# Altium footprint library lib_datalogger.PcbLib: 866 footprints (part 53 of 55)
Each footprint in its own frame and in the unit in brackets; x right, y up, seen from the top. Pads: shape width x height; smd on the part's side, far side on the other; paste and mask are expansions set on the pad; w line width, h text height; cw(c..) or ccw(c..) is an arc to the next point about the centre after c.
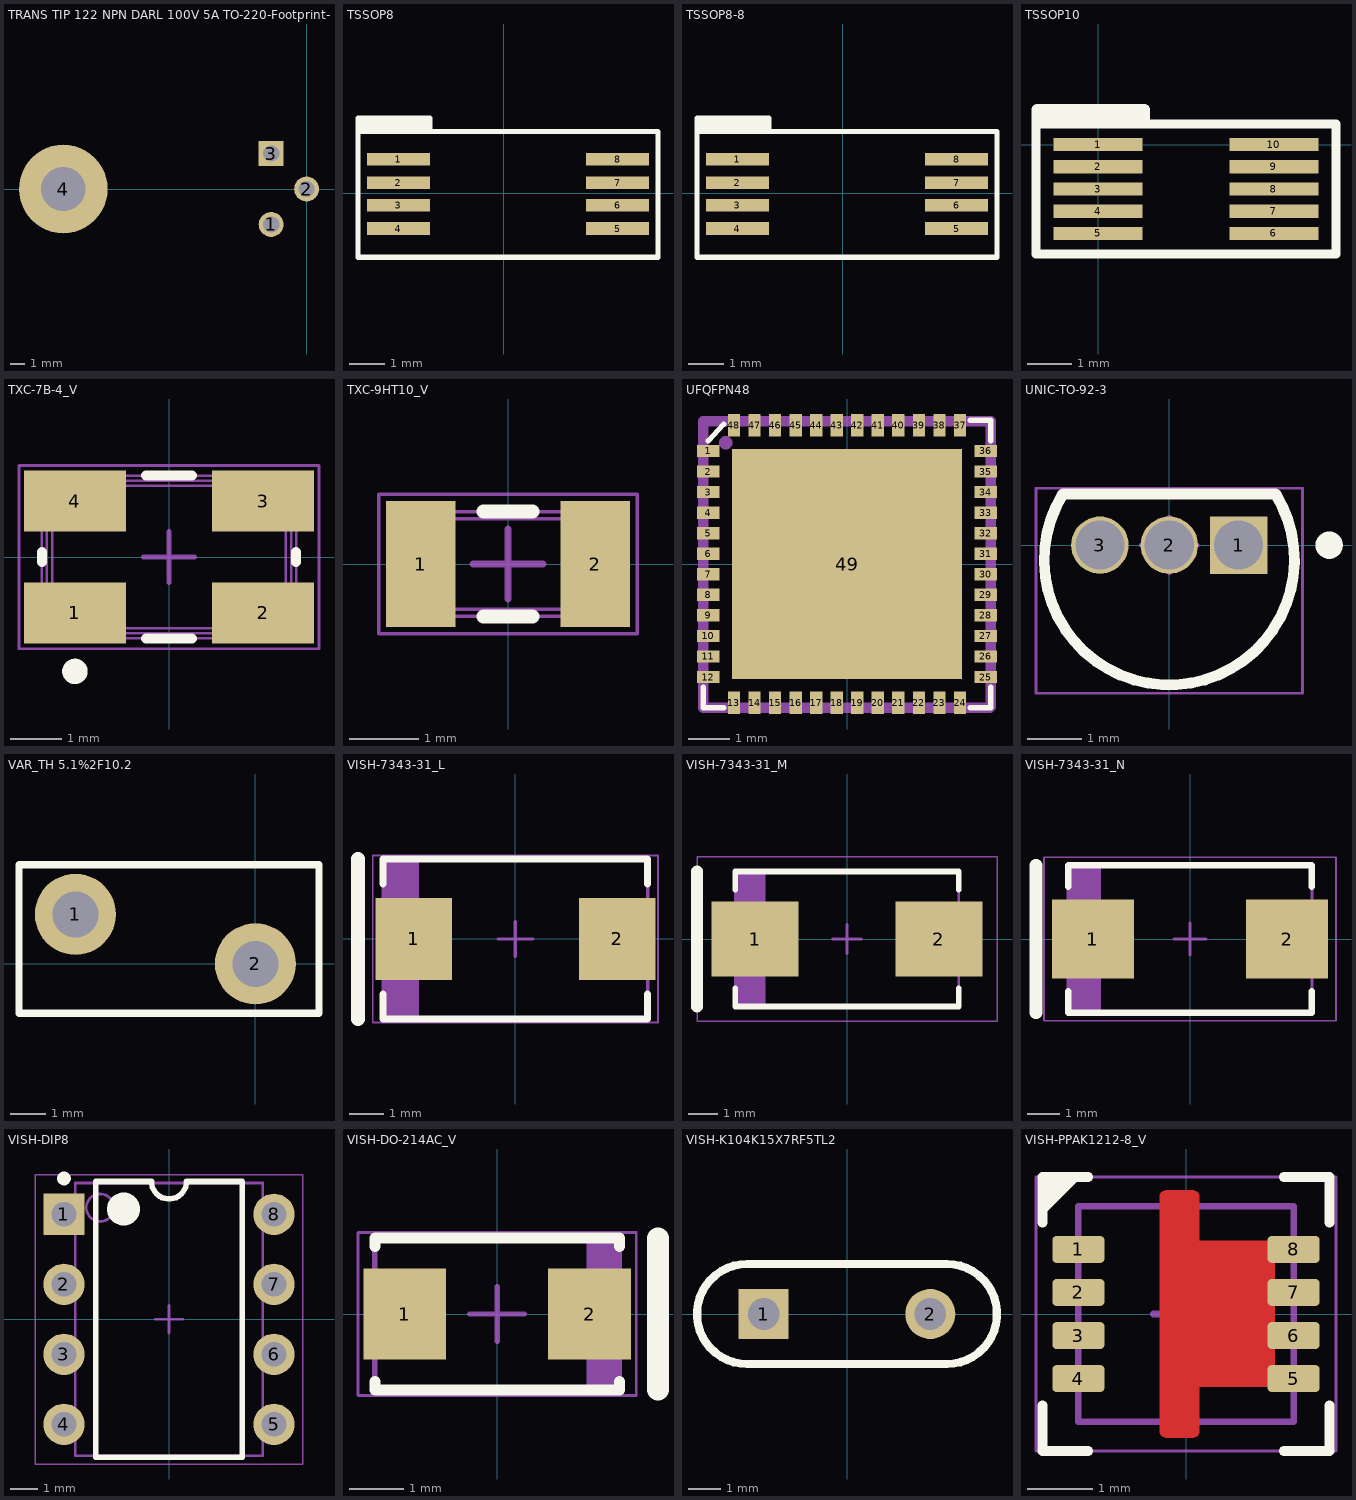
[diagram p52: the footprints below, top view; thin cyan lines are the x and y axes]

## TRANS TIP 122 NPN DARL 100V 5A TO-220-Footprint-1 [mil]
pads (4):
  round 70 hole 46: 1(-100,-100) 2(0,0)
  rect 70x70 hole 46: 3(-100,100)
  round 250 hole 125: 4(-686,0)
Bottom Overlay:
  lines w10: -441,-202 -441,202 ; -391,-202 -391,202 ; -806,-202 -806,202 -186,202 -186,-202 -806,-202
3D body: height 100, standoff -50, extent -120,80 -80,120
3D body: height 100, standoff -50, extent -20,-20 20,20
3D body: height 100, standoff -50, extent -120,-120 -80,-80
3D body: height 120, standoff 80, extent -120,-120 -80,-80
3D body: height 120, standoff 80, extent -250,-120 -100,-80
3D body: height 120, standoff 80, extent -250,80 -100,120
3D body: height 120, standoff 80, extent -250,-20 0,20
3D body: height 120, standoff 80, extent -20,-20 20,20
3D body: height 120, standoff 80, extent -120,80 -80,120
3D body: height 150, standoff 5, extent -445,-200 -190,195
3D body: height 20, standoff 5, extent -810,-200 -440,200

## TSSOP8 [mil]
pads (8):
  rect 70x14 smd: 1(-117,38) 2(-117,12) 3(-117,-13) 4(-117,-39) 5(127,-39) 6(127,-13) 7(127,12) 8(127,38)
Top Overlay:
  region: -82,69 -82,84 -162,84 -162,69
  lines w6: -82,69 -82,84 -162,84 -162,69 ; -162,69 -162,-1 -162,-71 172,-71 172,69 -162,69
3D body "TSS0P8.step": height 43, standoff 0, extent -118.62,-62.11 128.62,56

## TSSOP8-8 [mil]
pads (8):
  rect 70x14 smd: 1(-117,38) 2(-117,12) 3(-117,-13) 4(-117,-39) 5(127,-39) 6(127,-13) 7(127,12) 8(127,38)
Top Overlay:
  region: -82,69 -82,84 -162,84 -162,69
  lines w6: -82,69 -82,84 -162,84 -162,69 ; -162,69 -162,-1 -162,-71 172,-71 172,69 -162,69
3D body "TSS0P8.step": height 43, standoff 0, extent -118.62,-62.11 128.62,56

## TSSOP10 [mm]
height 2
pads (10):
  rect 2x0.3 smd: 1(0,0) 2(0,-0.5) 3(0,-1) 4(0,-1.5) 5(0,-2) 6(3.95,-2) 7(3.95,-1.5) 8(3.95,-1) 9(3.95,-0.5) 10(3.95,0)
Top Overlay:
  lines w0.2: -1.399,0.615 -1.399,-2.464 5.347,-2.464 5.347,0.457 -1.088,0.457 ; -1.348,0.463 -1.064,0.463
  lines w0.254: -1.372,0.693 -1.372,0.787 1.041,0.787 1.041,0.483 ; -1.297,0.641 1.04,0.641
3D body "MSOP-10-1.step": height 1.05, standoff 0, extent -0.539,-2.5 4.488,0.5

## TXC-7B-4_V [mm] "SMD, 4-Leads, Body 5x3.2mm, Pitch 3.7mm"
height 1.05
pads (4):
  rect 2x1.2 smd: 1(-1.85,-1.1) 2(1.85,-1.1) 3(1.85,1.1) 4(-1.85,1.1)
Top Overlay:
  circle w0.25: c-1.85,-2.25 r0.125
  lines w0.2: -2.5,-0.1 -2.5,0.1 ; -0.45,-1.6 0.45,-1.6 ; -0.45,1.6 0.45,1.6 ; 2.5,-0.1 2.5,0.1
Mechanical 13:
  lines w0.05: -2.5,-1.5 cw(c-2.5,-1.6) -2.4,-1.6 2.4,-1.6 cw(c2.5,-1.6) 2.5,-1.5 2.5,1.5 cw(c2.5,1.6) 2.4,1.6 -2.4,1.6 cw(c-2.5,1.6) -2.5,1.5 -2.5,-1.5 ; -2.4,-1.4 ccw(c-2.3,-1.4) -2.3,-1.5 2.3,-1.5 ccw(c2.3,-1.4) 2.4,-1.4 2.4,1.4 ccw(c2.3,1.4) 2.3,1.5 -2.3,1.5 ccw(c-2.3,1.4) -2.4,1.4 -2.4,-1.4 ; -2.3,-1.3 ccw(c-2.2,-1.3) -2.2,-1.4 2.2,-1.4 ccw(c2.2,-1.3) 2.3,-1.3 2.3,1.3 ccw(c2.2,1.3) 2.2,1.4 -2.2,1.4 ccw(c-2.2,1.3) -2.3,1.3 -2.3,-1.3
Mechanical 15:
  lines w0.05: -2.95,-1.8 2.95,-1.8 2.95,1.8 -2.95,1.8 -2.95,-1.8
  lines w0.1: -0.5,0 0.5,0 ; 0,-0.5 0,0.5
3D body: height 1.05, standoff 1, extent -2.299,-1.399 2.299,1.399
3D body: height 1, standoff 0.8, extent -2.399,-1.499 2.399,1.499
3D body: height 0.6, standoff 0, extent -2.501,-1.601 2.501,1.601
3D body: height 0.8, standoff 0.75, extent -2.5,-1.6 2.501,1.601

## TXC-9HT10_V [mm] "SMD, 2-Leads, Body 3.2x1.5mm"
height 0.85
pads (2):
  rect 1x1.8 smd: 1(-1.25,0) 2(1.25,0)
Top Overlay:
  lines w0.2: -0.35,-0.75 0.35,-0.75 ; -0.35,0.75 0.35,0.75
Mechanical 13:
  lines w0.05: -1.6,-0.65 cw(c-1.6,-0.75) -1.5,-0.75 1.5,-0.75 cw(c1.6,-0.75) 1.6,-0.65 1.6,0.65 cw(c1.6,0.75) 1.5,0.75 -1.5,0.75 cw(c-1.6,0.75) -1.6,0.65 -1.6,-0.65 ; -1.5,-0.55 ccw(c-1.4,-0.55) -1.4,-0.65 1.4,-0.65 ccw(c1.4,-0.55) 1.5,-0.55 1.5,0.55 ccw(c1.4,0.55) 1.4,0.65 -1.4,0.65 ccw(c-1.4,0.55) -1.5,0.55 -1.5,-0.55
Mechanical 15:
  lines w0.05: -1.85,-1 -1.85,1 1.85,1 1.85,-1 -1.85,-1
  lines w0.1: -0.5,0 0.5,0 ; 0,-0.5 0,0.5
3D body: height 0.75, standoff 0, extent -1.601,-0.751 1.601,0.751
3D body: height 0.85, standoff 0.75, extent -1.499,-0.649 1.499,0.649

## UFQFPN48 [mm]
pads (49):
  rect 0.55x0.3 smd mask+0.03: 1(-3.375,2.75) 2(-3.375,2.25) 3(-3.375,1.75) 4(-3.375,1.25) 5(-3.375,0.75) 6(-3.375,0.25) 7(-3.375,-0.25) 8(-3.375,-0.75) 9(-3.375,-1.25) 10(-3.375,-1.75) 11(-3.375,-2.25) 12(-3.375,-2.75) 25(3.375,-2.75) 26(3.375,-2.25) 27(3.375,-1.75) 28(3.375,-1.25) 29(3.375,-0.75) 30(3.375,-0.25) 31(3.375,0.25) 32(3.375,0.75) 33(3.375,1.25) 34(3.375,1.75) 35(3.375,2.25) 36(3.375,2.75)
  rect 0.3x0.55 smd mask+0.03: 13(-2.75,-3.375) 14(-2.25,-3.375) 15(-1.75,-3.375) 16(-1.25,-3.375) 17(-0.75,-3.375) 18(-0.25,-3.375) 19(0.25,-3.375) 20(0.75,-3.375) 21(1.25,-3.375) 22(1.75,-3.375) 23(2.25,-3.375) 24(2.75,-3.375) 37(2.75,3.375) 38(2.25,3.375) 39(1.75,3.375) 40(1.25,3.375) 41(0.75,3.375) 42(0.25,3.375) 43(-0.25,3.375) 44(-0.75,3.375) 45(-1.25,3.375) 46(-1.75,3.375) 47(-2.25,3.375) 48(-2.75,3.375)
  rect 5.6x5.6 smd paste-2.15 mask+0.051: 49(0,0)
Top Overlay:
  lines w0.127: -3.5,-3 -3.5,-3.5 -3,-3.5 ; -3.375,3 -3,3.4 ; 3,-3.5 3.5,-3.5 3.5,-3 ; 3,3.5 3.5,3.5 3.5,3
Mechanical 16:
  circle w0.254: c-2.95,2.95 r0.035
  lines w0.254: -3.5,-3.5 -3.5,3.475 3.5,3.475 3.5,-3.475 3.475,-3.5 -3.5,-3.5
3D body "UFQFPN48.STEP": height 0.67, standoff -0.12, extent -3.498,-3.5 3.517,3.5

## UNIC-TO-92-3 [mm] "TO-92, 3-Leads, Dia 4.58mm, Pitch 1.27mm"
height 7.23
pads (3):
  rect 1.05x1.05 hole 0.9: 1(1.27,0)
  round 1.05 hole 0.9: 2(0,0) 3(-1.27,0)
Top Overlay:
  circle w0.25: c2.928,0 r0.125
  lines w0.2: -1.944,0.94 ccw(c0,-0.27) 1.944,0.94 -1.944,0.94
Mechanical 13:
  lines w0.1: -1.944,0.94 ccw(c0,-0.27) 1.944,0.94 -1.944,0.94
Mechanical 15:
  lines w0.05: -2.44,-2.71 2.44,-2.71 2.44,1.04 -2.44,1.04 -2.44,-2.71
  lines w0.1: -0.5,0 0.5,0 ; 0,-0.5 0,0.5
3D body: height 2.4, standoff -10.8, extent 1.022,-0.249 1.52,0.25
3D body: height 2.4, standoff -10.8, extent -0.248,-0.249 0.25,0.25
3D body: height 2.4, standoff -10.8, extent -1.518,-0.249 -1.02,0.25
3D body: height 7.23, standoff 2.4, extent -2.296,-2.6 2.3,0.94

## VAR_TH 5.1%2F10.2 [mm] "Jumper Wire; 2 Leads"
height 0.6
pads (2):
  round 2.3 hole 1.3: 1(-5.1,1.4) 2(0,0)
Top Overlay:
  lines w0.2: -6.7,-1.4 1.8,-1.4 1.8,2.806 -6.7,2.806 -6.7,-1.4
3D body "User Library-SIOV-S Varistor.step": height 8.5, standoff -29.5, extent -6,-1.1 1,2.2

## VISH-7343-31_L [mm] "Molded Capacitor, 2-Leads, Body 7.6x4.6mm, IPC High Density"
height 3.1
pads (2):
  rect 2.2x2.35 smd: 1(-2.925,0) 2(2.925,0)
Top Overlay:
  lines w0.2: -3.8,-1.575 -3.8,-2.3 3.8,-2.3 3.8,-1.575 ; -3.8,1.575 -3.8,2.3 3.8,2.3 3.8,1.575
  lines w0.4: -4.525,-2.3 -4.525,2.3
Mechanical 13:
  rectangle: -3.8,-2.3 -2.778,2.3
  lines w0.1: -3.8,-2.3 3.8,-2.3 3.8,2.3 -3.8,2.3 -3.8,-2.3
Mechanical 15:
  lines w0.05: -4.1,-2.4 4.1,-2.4 4.1,2.4 -4.1,2.4 -4.1,-2.4
  lines w0.1: -0.5,0 0.5,0 ; 0,-0.5 0,0.5
3D body "CAPMP7343X31L.step": height 3.1, standoff 0, extent -4.02,-2.3 4.02,2.3

## VISH-7343-31_M [mm] "Molded Capacitor, 2-Leads, Body 7.6x4.6mm, IPC Low Density"
height 3.1
pads (2):
  rect 2.95x2.55 smd: 1(-3.125,0) 2(3.125,0)
Top Overlay:
  lines w0.2: -3.8,-1.675 -3.8,-2.3 3.8,-2.3 3.8,-1.675 ; -3.8,1.675 -3.8,2.3 3.8,2.3 3.8,1.675
  lines w0.4: -5.1,-2.3 -5.1,2.3
Mechanical 13:
  rectangle: -3.8,-2.3 -2.778,2.3
  lines w0.1: -3.8,-2.3 3.8,-2.3 3.8,2.3 -3.8,2.3 -3.8,-2.3
Mechanical 15:
  lines w0.05: -5.1,-2.8 5.1,-2.8 5.1,2.8 -5.1,2.8 -5.1,-2.8
  lines w0.1: -0.5,0 0.5,0 ; 0,-0.5 0,0.5
3D body "CAPMP7343X31M.step": height 3.1, standoff 0, extent -4.02,-2.3 4.02,2.3

## VISH-7343-31_N [mm] "Molded Capacitor, 2-Leads, Body 7.6x4.6mm, IPC Medium Density"
height 3.1
pads (2):
  rect 2.55x2.45 smd: 1(-3.025,0) 2(3.025,0)
Top Overlay:
  lines w0.2: -3.8,-1.625 -3.8,-2.3 3.8,-2.3 3.8,-1.625 ; -3.8,1.625 -3.8,2.3 3.8,2.3 3.8,1.625
  lines w0.4: -4.8,-2.3 -4.8,2.3
Mechanical 13:
  rectangle: -3.8,-2.3 -2.778,2.3
  lines w0.1: -3.8,-2.3 3.8,-2.3 3.8,2.3 -3.8,2.3 -3.8,-2.3
Mechanical 15:
  lines w0.05: -4.55,-2.55 4.55,-2.55 4.55,2.55 -4.55,2.55 -4.55,-2.55
  lines w0.1: -0.5,0 0.5,0 ; 0,-0.5 0,0.5
3D body "CAPMP7343X31N.step": height 3.1, standoff 0, extent -4.02,-2.3 4.02,2.3

## VISH-DIP8 [mm] "DIP, 8-Leads, Body 9.9x6.8mm, Pitch 2.54mm"
height 4.58
pads (8):
  rect 1.5x1.5 hole 0.9: 1(-3.81,3.81)
  round 1.5 hole 0.9: 2(-3.81,1.27) 3(-3.81,-1.27) 4(-3.81,-3.81) 5(3.81,-3.81) 6(3.81,-1.27) 7(3.81,1.27) 8(3.81,3.81)
Top Overlay:
  circle w0.6: c-1.65,4 r0.3
  circle w0.25: c-3.81,5.11 r0.125
  lines w0.2: -2.65,-5 2.65,-5 2.65,5 0.635,5 cw(c0,5) -0.635,5 -2.65,5 -2.65,-5
Mechanical 13:
  circle w0.1: c-2.5,4.05 r0.5
  lines w0.1: -3.4,-4.95 3.4,-4.95 3.4,4.95 -3.4,4.95 -3.4,-4.95
Mechanical 15:
  lines w0.05: -4.85,-5.25 4.85,-5.25 4.85,5.25 -4.85,5.25 -4.85,-5.25
  lines w0.1: -0.5,0 0.5,0 ; 0,-0.5 0,0.5
3D body: height 4.58, standoff 0.51, extent -3.4,-4.95 3.4,4.95
3D body: height 0, standoff -1.6, extent 3.675,3.45 3.945,4.17
3D body: height 2.68, standoff 2.41, extent 3.4,3.31 3.945,4.31
3D body: height 2.41, standoff 0, extent 3.675,3.31 3.945,4.31
3D body: height 0, standoff -1.6, extent 3.675,0.91 3.945,1.63
3D body: height 2.68, standoff 2.41, extent 3.4,0.77 3.945,1.77
3D body: height 2.41, standoff 0, extent 3.675,0.77 3.945,1.77
3D body: height 0, standoff -1.6, extent 3.675,-1.63 3.945,-0.91
3D body: height 2.68, standoff 2.41, extent 3.4,-1.77 3.945,-0.77
3D body: height 2.41, standoff 0, extent 3.675,-1.77 3.945,-0.77
3D body: height 0, standoff -1.6, extent 3.675,-4.17 3.945,-3.45
3D body: height 2.68, standoff 2.41, extent 3.4,-4.31 3.945,-3.31
3D body: height 2.41, standoff 0, extent 3.675,-4.31 3.945,-3.31
3D body: height 0, standoff -1.6, extent -3.945,-4.17 -3.675,-3.45
3D body: height 2.68, standoff 2.41, extent -3.945,-4.31 -3.4,-3.31
3D body: height 2.41, standoff 0, extent -3.945,-4.31 -3.675,-3.31
3D body: height 0, standoff -1.6, extent -3.945,-1.63 -3.675,-0.91
3D body: height 2.68, standoff 2.41, extent -3.945,-1.77 -3.4,-0.77
3D body: height 2.41, standoff 0, extent -3.945,-1.77 -3.675,-0.77
3D body: height 0, standoff -1.6, extent -3.945,0.91 -3.675,1.63
3D body: height 2.68, standoff 2.41, extent -3.945,0.77 -3.4,1.77
3D body: height 2.41, standoff 0, extent -3.945,0.77 -3.675,1.77
3D body: height 0, standoff -1.6, extent -3.945,3.45 -3.675,4.17
3D body: height 2.68, standoff 2.41, extent -3.945,3.31 -3.4,4.31
3D body: height 2.41, standoff 0, extent -3.945,3.31 -3.675,4.31

## VISH-DO-214AC_V [mm] "Molded Diode, 2-Leads, Body 4.5x2.79mm"
height 2.29
pads (2):
  rect 1.52x1.68 smd: 1(-1.7,0) 2(1.7,0)
Top Overlay:
  lines w0.2: -2.25,-1.24 -2.25,-1.4 2.25,-1.4 2.25,-1.24 ; -2.25,1.24 -2.25,1.4 2.25,1.4 2.25,1.24
  lines w0.4: 2.96,-1.395 2.96,1.395
Mechanical 13:
  rectangle: 1.645,-1.395 2.25,1.395
  lines w0.1: -2.25,-1.395 -2.25,1.395 2.25,1.395 2.25,-1.395 -2.25,-1.395
Mechanical 15:
  lines w0.05: -2.56,-1.5 -2.56,1.5 2.56,1.5 2.56,-1.5 -2.56,-1.5
  lines w0.1: -0.5,0 0.5,0 ; 0,-0.5 0,0.5
3D body "DIOM4227X23L.step": height 2.29, standoff 0, extent -2.47,-1.395 2.47,1.395

## VISH-K104K15X7RF5TL2 [mil] "THD, 2-Leads, Body 4x2.6mm"
height 220.47
pads (2):
  rect 60x60 hole 38: 1(-100,0)
  round 60 hole 38: 2(100,0)
Top Overlay:
  lines w10: -120,-60 cw(c-120,0) -120,60 120,60 cw(c120,0) 120,-60 -120,-60
3D body "c322c104m5u5ta.stp": height 307.51, standoff -227.96, extent -110.04,-65 110.04,60.39

## VISH-PPAK1212-8_V [mm] "SMD, 8-Leads, Body 3.21x3.21mm, Pitch 0.66mm"
height 1.12
pads (8):
  rrect30% 0.8x0.41 smd: 1(-1.65,0.99) 2(-1.65,0.33) 3(-1.65,-0.33) 4(-1.65,-0.99) 5(1.65,-0.99) 6(1.65,-0.33) 7(1.65,0.33) 8(1.65,0.99)
Top Layer:
  region: -0.4,1.8 -0.4,-1.8 -0.4,-1.82 -0.385,-1.857 -0.357,-1.885 -0.32,-1.9 -0.3,-1.9 0.1,-1.9 0.12,-1.9 0.157,-1.885 0.185,-1.857 0.2,-1.82 0.2,-1.8 0.2,-1.117 1.363,-1.117 1.363,1.123 0.2,1.123 0.2,1.8 0.2,1.82 0.185,1.857 0.157,1.885 0.12,1.9 0.1,1.9 -0.3,1.9 -0.32,1.9 -0.357,1.885 -0.385,1.857 -0.4,1.82
Top Overlay:
  region: -2.2,2.1 -2.2,1.6 -1.7,2.1
  lines w0.15: -2.2,-1.4 -2.2,-2.1 -1.5,-2.1 ; -2.2,1.4 -2.2,2.1 -1.5,2.1 ; -2.2,1.6 -1.7,2.1 ; 1.5,-2.1 2.2,-2.1 2.2,-1.4 ; 1.5,2.1 2.2,2.1 2.2,1.4
Mechanical 13:
  lines w0.1: -1.65,-1.65 -1.65,1.65 1.65,1.65 1.65,-1.65 -1.65,-1.65
Mechanical 15:
  lines w0.05: -2.3,-2.1 -2.3,2.1 2.3,2.1 2.3,-2.1 -2.3,-2.1
  lines w0.1: -0.5,0 0.5,0 ; 0,-0.5 0,0.5
Top Designator:
  text ".Designator" at -0.635,-1.397 h0.6
3D body "PowerPAK 1212-8 Single Pad.step": height 1.1, standoff 0.06, extent -1.775,-1.775 1.775,1.775